# Altium footprint library DipComponent.PcbLib: 303 footprints (part 19 of 19)
Each footprint in its own frame and in the unit in brackets; x right, y up, seen from the top. Pads: shape width x height; smd on the part's side, far side on the other; paste and mask are expansions set on the pad; w line width, h text height; cw(c..) or ccw(c..) is an arc to the next point about the centre after c.
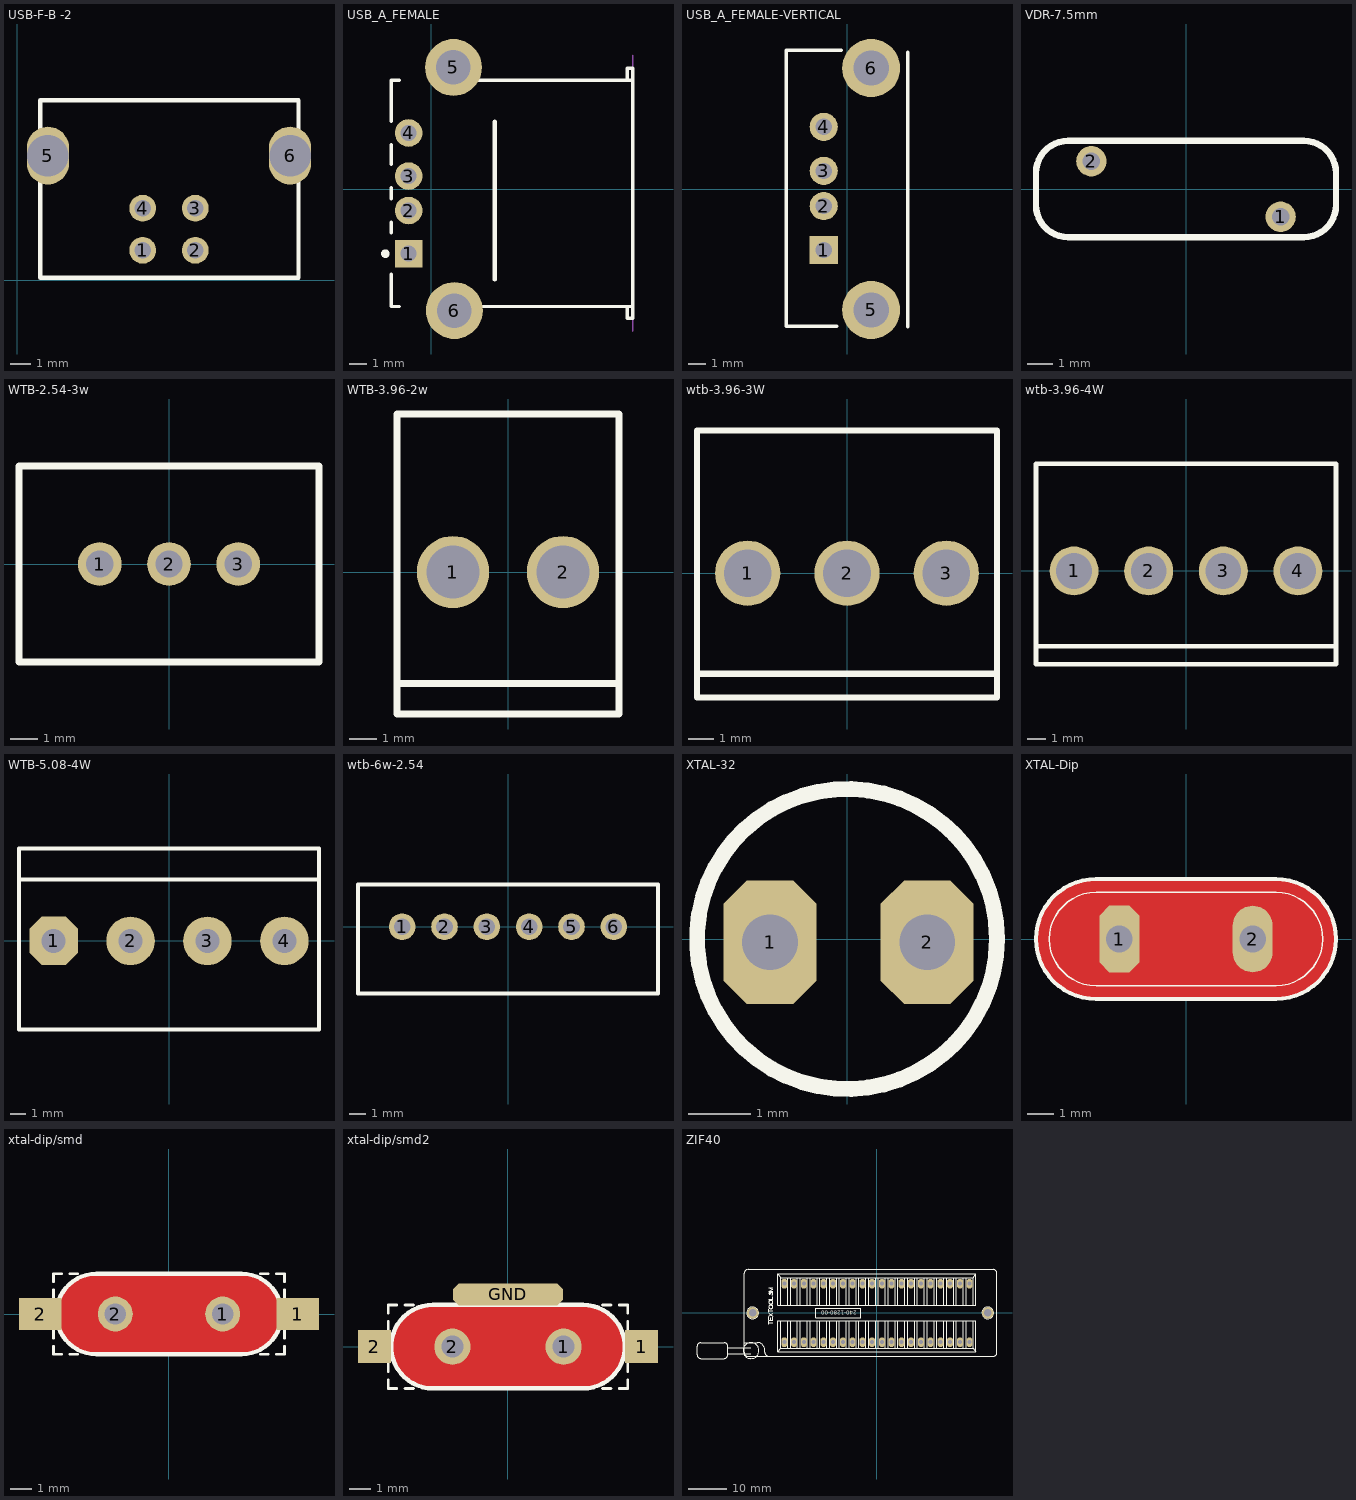
[diagram p18: the footprints below, top view; thin cyan lines are the x and y axes]

## USB-F-B -2 [mil]
pads (6):
  round 51 hole 31.5: 1(238.5,56.5) 2(338.5,56.5) 3(338.5,136.5) 4(238.5,136.5)
  oval 80x110 hole 78.74: 5(58.5,236.5) 6(518.5,236.5)
Top Overlay:
  lines w8: 44,4.5 534.5,4.5 534.5,341.5 44,341.5 44,4.5
3D body "User Library-Samtec - USB-B-S-X-W-TH.STEP": height 433.07, standoff -143.42, extent 0.71,0.71 583.33,650.32

## USB_A_FEMALE [mm]
pads (6):
  rect 1.6x1.6 hole 0.92: 1(-1.325,-3.75)
  round 1.6 hole 0.92: 2(-1.325,-1.25) 3(-1.325,0.75) 4(-1.325,3.25)
  round 3.3 hole 2: 5(1.275,7.05) 6(1.325,-7.05)
Top Overlay:
  circle w0.25: c-2.675,-3.75 r0.125
  lines w0.2: -2.325,-4.95 -2.325,-6.815 -1.875,-6.815 ; -2.325,-2.55 -2.325,-1.92 ; -2.325,-0.58 -2.325,0.08 ; -2.325,1.42 -2.325,2.58 ; -2.325,3.92 -2.325,6.315 -1.875,6.315 ; 2.225,-6.815 11.675,-6.815 ; 2.225,6.315 11.675,6.315 ; 11.355,-6.815 11.355,-7.5 11.675,-7.5 11.675,-6.815 ; 11.355,6.315 11.355,7 11.675,7 11.675,6.315 ; 11.675,-6.815 11.675,6.315
  lines w0.254: 3.675,-5.25 3.675,3.9
Mechanical 1:
  lines w0.1: 11.675,-8.25 11.675,7.75
  text "PCB Edge" at 11.339,-6.553 h0.25
3D body "Samtec-USB-A-S-F-B-TH.STEP": height 2.77, standoff -8.15, extent -2.325,-8.1 11.775,7.699

## USB_A_FEMALE-VERTICAL [mm]
pads (6):
  rect 1.6x1.6 hole 0.92: 1(-1.348,-3.469)
  round 1.6 hole 0.92: 2(-1.348,-0.969) 3(-1.348,1.031) 4(-1.348,3.531)
  round 3.3 hole 2: 5(1.348,-6.871) 6(1.348,6.871)
Top Overlay:
  lines w0.2: -0.61,-7.798 -3.48,-7.798 -3.48,7.874 -0.356,7.874 ; 3.429,-7.823 3.429,7.772
3D body "614004135023.stp": height 14.8, standoff -4, extent -3.458,-7.819 3.382,7.881

## VDR-7.5mm [mm]
pads (2):
  round 1.2 hole 0.7: 1(3.75,-1.1) 2(-3.75,1.1)
Top Overlay:
  lines w0.254: -5.944,-0.635 ccw(c-4.674,-0.635) -4.674,-1.905 0,-1.905 4.674,-1.905 ccw(c4.674,-0.635) 5.944,-0.635 5.944,0 5.944,0.635 ccw(c4.674,0.635) 4.674,1.905 0,1.905 -4.674,1.905 ccw(c-4.674,0.635) -5.944,0.635 -5.944,0 -5.944,-0.635
3D body "vdr8mm.STEP": height 13, standoff -2.5, extent -6,-1.876 6,1.925

## WTB-2.54-3w [mm]
pads (3):
  round 1.6 hole 1: 1(-2.54,0) 2(0,0) 3(2.54,0)
Top Overlay:
  lines w0.254: -5.5,-3.6 -5.5,3.6 5.5,3.6 5.5,-3.6 -5.5,-3.6
3D body "wtb-2.54-3w.stp": height 10.95, standoff -2.85, extent -5.459,-3.605 5.511,3.605

## WTB-3.96-2w [mm]
pads (2):
  round 2.6 hole 1.9: 1(-1.98,0) 2(1.98,0)
Top Overlay:
  lines w0.254: -4,-4 4,-4 ; -4,-5.105 -4,5.69 4,5.69 4,-5.105 -4,-5.105
3D body "wtb3.96S.stp": height 14.25, standoff -3.2, extent -4.065,-5.092 3.965,5.658

## wtb-3.96-3W [mm]
pads (3):
  round 2.6 hole 1.9: 1(-3.96,0) 2(0,0) 3(3.96,0)
Top Overlay:
  lines w0.254: -5.98,-4 5.969,-4 ; -5.98,-4.953 -5.98,5.69 5.98,5.69 5.98,-4.953 -5.98,-4.953
3D body "wtb3.96S.stp": height 14.25, standoff -3.2, extent -6.045,-5.092 1.985,5.658
3D body "wtb3.96S.stp": height 14.25, standoff -3.2, extent -2.085,-5.092 5.945,5.658

## wtb-3.96-4W [mm] "wire to borad\"
pads (4):
  round 2.6 hole 1.9: 1(-5.94,0) 2(-1.98,0) 3(1.98,0) 4(5.94,0)
Top Overlay:
  lines w0.254: -7.96,-4 7.925,-4 ; 7.95,-4.953 -7.96,-4.953 -7.96,5.69 7.96,5.69 7.96,-4.953
3D body "wtb3.96S.stp": height 14.25, standoff -3.2, extent -8.025,-5.092 0.005,5.658
3D body "wtb3.96S.stp": height 14.25, standoff -3.2, extent -0.105,-5.092 7.925,5.658

## WTB-5.08-4W [mm]
pads (4):
  oct 3.2x3.2 hole 1.6: 1(-7.62,0)
  round 3.2 hole 1.6: 2(-2.54,0) 3(2.54,0) 4(7.62,0)
Top Overlay:
  lines w0.254: -9.906,4.064 9.906,4.064 ; -9.906,-5.842 9.906,-5.842 9.906,6.096 -9.906,6.096 -9.906,-5.842
3D body "WTB-5.08mm-4W.stp": height 13.85, standoff -3.6, extent -9.62,-5.6 9.62,5.8

## wtb-6w-2.54 [mm]
pads (6):
  round 1.6 hole 1: 1(-6.35,0) 2(-3.81,0) 3(-1.27,0) 4(1.27,0) 5(3.81,0) 6(6.35,0)
Top Overlay:
  lines w0.254: -9,-4.013 9,-4.013 9,2.54 -9,2.54 -9,-4.013
3D body "HDR-6x1-box.stp": height 11.71, standoff -3.4, extent -8.89,-4.064 8.89,2.54

## XTAL-32 [mm] "crystall clock 32.768 mhz"
pads (2):
  oct 1.5x2 hole 0.9: 1(-1.245,-0.051) 2(1.295,-0.051)
Top Overlay:
  circle w0.254: c0,0 r2.426
3D body "rtc crystall.step": height 1.95, standoff -9.2, extent -1.651,-1.651 1.449,1.449

## XTAL-Dip [mil]
pads (2):
  oct 60x100 hole 40: 1(-100,0)
  oval 60x100 hole 40: 2(100,0)
Top Layer:
  pour cut-out: -135,-90 135,-90 143.86,-90 161.25,-86.54 177.63,-79.76 192.37,-69.91 204.91,-57.37 214.76,-42.63 221.54,-26.25 225,-8.86 225,8.86 221.54,26.25 214.76,42.63 204.91,57.37 192.37,69.91 177.63,79.76 161.25,86.54 143.86,90 135,90 -135,90 -143.86,90 -161.25,86.54 -177.63,79.76 -192.37,69.91 -204.91,57.37 -214.76,42.63 -221.54,26.25 -225,8.86 -225,-8.86 -221.54,-26.25 -214.76,-42.63 -204.91,-57.37 -192.37,-69.91 -177.63,-79.76 -161.25,-86.54 -143.86,-90
Bottom Layer:
  pour cut-out: -135,-90 135,-90 143.86,-90 161.25,-86.54 177.63,-79.76 192.37,-69.91 204.91,-57.37 214.76,-42.63 221.54,-26.25 225,-8.86 225,8.86 221.54,26.25 214.76,42.63 204.91,57.37 192.37,69.91 177.63,79.76 161.25,86.54 143.86,90 135,90 -135,90 -143.86,90 -161.25,86.54 -177.63,79.76 -192.37,69.91 -204.91,57.37 -214.76,42.63 -221.54,26.25 -225,8.86 -225,-8.86 -221.54,-26.25 -214.76,-42.63 -204.91,-57.37 -192.37,-69.91 -177.63,-79.76 -161.25,-86.54 -143.86,-90
Top Overlay:
  lines w2: -135,-70 cw(c-135,0) -135,70 135,70 cw(c135,0) 135,-70 -135,-70
  lines w6: -135,-90 cw(c-135,0) -135,90 135,90 cw(c135,0) 135,-90 -135,-90
3D body: height 118.11, standoff 0, extent 85,-15 116.37,16.43
3D body: height 118.11, standoff 0, extent -116.37,-15.72 -85,15.72
3D body "crystall.step": height 149.61, standoff -145.67, extent -225,-90 221.85,93.07

## xtal-dip/smd [mil]
pads (4):
  round 65 hole 39.37: 1(100,0) 2(-100,0)
  rect 78.74x59.06 smd: 1(240,0) 2(-240,0)
Top Layer:
  pour cut-out: 135,75 142.39,75 156.88,72.12 170.53,66.46 182.81,58.26 193.26,47.81 201.46,35.53 207.12,21.88 210,7.39 210,0 210,-7.39 207.12,-21.88 201.46,-35.53 193.26,-47.81 182.81,-58.26 170.53,-66.46 156.88,-72.12 142.39,-75 135,-75 -135,-75 -142.39,-75 -156.88,-72.12 -170.53,-66.46 -182.81,-58.26 -193.26,-47.81 -201.46,-35.53 -207.12,-21.88 -210,-7.39 -210,0 -210,7.39 -207.12,21.88 -201.46,35.53 -193.26,47.81 -182.81,58.26 -170.53,66.46 -156.88,72.12 -142.39,75 -135,75
Top Overlay:
  lines w5: -215,-60 -215,-75 -200,-75 ; -215,-45 -215,-30 ; -215,30 -215,45 ; -215,60 -215,75 -200,75 ; -185,-75 -170,-75 ; -185,75 -170,75 ; 170,-75 185,-75 ; 170,75 185,75 ; 200,-75 215,-75 215,-60 ; 200,75 215,75 215,60 ; 215,-45 215,-30 ; 215,30 215,45
  lines w8: -135,-75 cw(c-135,0) -135,75 135,75 cw(c135,0) 135,-75 -135,-75
3D body "Crystal.STEP": height 134.46, standoff 0.6, extent -206.39,-88 207,89.16

## xtal-dip/smd2 [mm]
pads (5):
  round 1.651 hole 1: 1(2.54,0) 2(-2.54,0)
  rect 1.5x1.5 smd: 1(6.096,0) 2(-6.096,0)
  oct 5x1 smd: GND(0,2.388)
Top Layer:
  pour cut-out: 3.429,1.905 3.617,1.905 3.985,1.832 4.331,1.688 4.643,1.48 4.909,1.214 5.117,0.902 5.261,0.556 5.334,0.188 5.334,0 5.334,-0.188 5.261,-0.556 5.117,-0.902 4.909,-1.214 4.643,-1.48 4.331,-1.688 3.985,-1.832 3.617,-1.905 3.429,-1.905 -3.429,-1.905 -3.617,-1.905 -3.985,-1.832 -4.331,-1.688 -4.643,-1.48 -4.909,-1.214 -5.117,-0.902 -5.261,-0.556 -5.334,-0.188 -5.334,0 -5.334,0.188 -5.261,0.556 -5.117,0.902 -4.909,1.214 -4.643,1.48 -4.331,1.688 -3.985,1.832 -3.617,1.905 -3.429,1.905
Top Overlay:
  lines w0.127: -5.461,-1.524 -5.461,-1.905 -5.08,-1.905 ; -5.461,-1.143 -5.461,-0.762 ; -5.461,0.762 -5.461,1.143 ; -5.461,1.524 -5.461,1.905 -5.08,1.905 ; -4.699,-1.905 -4.318,-1.905 ; -4.699,1.905 -4.318,1.905 ; 4.318,-1.905 4.699,-1.905 ; 4.318,1.905 4.699,1.905 ; 5.08,-1.905 5.461,-1.905 5.461,-1.524 ; 5.08,1.905 5.461,1.905 5.461,1.524 ; 5.461,-1.143 5.461,-0.762 ; 5.461,0.762 5.461,1.143
  lines w0.203: -3.429,-1.905 cw(c-3.429,0) -3.429,1.905 3.429,1.905 cw(c3.429,0) 3.429,-1.905 -3.429,-1.905
3D body "Crystal.STEP": height 3.42, standoff 0.02, extent -5.242,-2.235 5.258,2.265

## ZIF40 [mil]
height 472.44
pads (42):
  oct 60x100 hole 40: 1(-950,-300) 2(-850,-300) 3(-750,-300) 4(-650,-300) 5(-550,-300) 6(-450,-300) 7(-350,-300) 8(-250,-300) 9(-150,-300) 10(-50,-300) 11(50,-300) 12(150,-300) 13(250,-300) 14(350,-300) 15(450,-300) 16(550,-300) 17(650,-300) 18(750,-300) 19(850,-300) 20(950,-300) 21(950,300) 22(850,300) 23(750,300) 24(650,300) 25(550,300) 26(450,300) 27(350,300) 28(250,300) 29(150,300) 30(50,300) 31(-50,300) 32(-150,300) 33(-250,300) 34(-350,300) 35(-450,300) 36(-550,300) 37(-650,300) 38(-750,300) 39(-850,300) 40(-950,300)
  round 118.11 hole 78.74 unplated: ""(-1274.02,0) ""(1136.22,0)
Top Overlay:
  drawing of 197 lines, arcs and shapes, not listed
  text "240-1280-00" at -205,20 h40
3D body "SW3dPS-zif.STEP": height 433.07, standoff -196.85, extent -1842.35,-488.81 1196.68,450.79